# Altium footprint library PART.PcbLib: 407 footprints (part 14 of 26)
Each footprint in its own frame and in the unit in brackets; x right, y up, seen from the top. Pads: shape width x height; smd on the part's side, far side on the other; paste and mask are expansions set on the pad; w line width, h text height; cw(c..) or ccw(c..) is an arc to the next point about the centre after c.
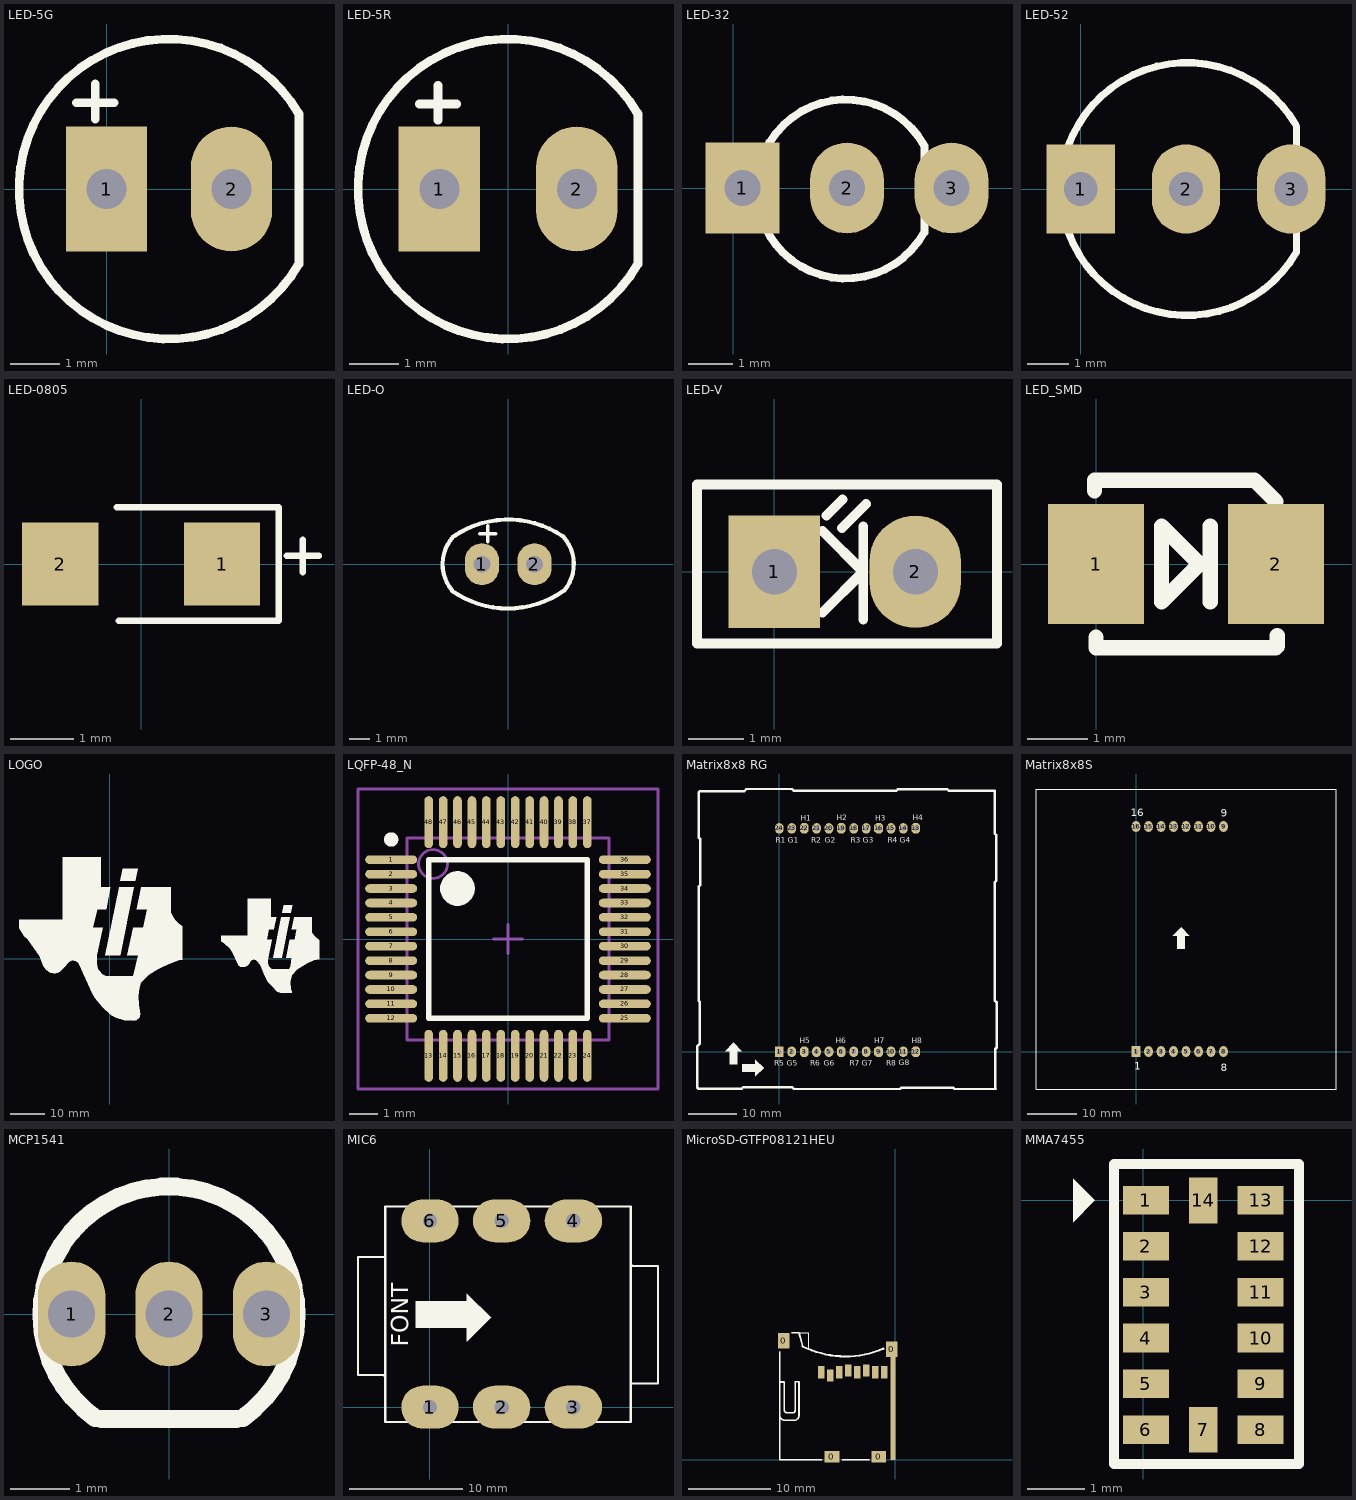
[diagram p13: the footprints below, top view; thin cyan lines are the x and y axes]

## LED-5G [mil] "LED 2 PIN, 5 ly ,Only Green Colour,pin to pin 100mil"
height 300
pads (2):
  rect 65x100 hole 32: 1(0,0)
  oval 65x100 hole 32: 2(100,0)
Top Overlay:
  lines w7: -24,69 6,69 ; -9,56 -9,84 ; 153.51,60.71 ccw(c50,0) 153.94,-59.97 ; 154,-59 154,60
3D body: height 386.85, standoff -67.48, extent -54.33,-103.66 154.33,105

## LED-5R [mil] "LED 2 PIN, 5 ly , Only Red colour, pin to pin 110mil"
height 300
pads (2):
  rect 65x100 hole 32: 1(-55,0)
  oval 65x100 hole 32: 2(55,0)
Top Overlay:
  lines w7: -71,68 -41,68 ; -56,55 -56,83 ; 103.51,60.71 ccw(c0,0) 103.94,-59.97 ; 104,-59 104,60
3D body: height 484.75, standoff -97.93, extent -115.69,-117 97.69,119.99

## LED-32 [mil] "LED 3 PIN, 3ly Two colour"
height 300
pads (3):
  rect 65x80 hole 32: 1(8,0)
  oval 65x80 hole 32: 2(100,0) 3(192,0)
Top Overlay:
  lines w7: 168,-39 168,37
  lines w7.01: 167.87,37.48 ccw(c99.08,-0.84) 167.97,-38.98

## LED-52 [mil] "LED 3 PIN, 5 ly , Two colour"
height 300
pads (3):
  rect 65x85 hole 32: 1(0,0)
  oval 65x85 hole 32: 2(100,0) 3(200,0)
Top Overlay:
  lines w7: 204.51,60.71 ccw(c101,0) 204.94,-59.97 ; 205,-59 205,59

## LED-0805 [mm] "Resistor SMD 80x50mil"
height 1.27
pads (2):
  rect 1.2x1.3 smd: 1(1.27,0) 2(-1.27,0)
Top Overlay:
  lines w0.102: -0.381,0.889 2.159,0.889 2.159,-0.889 -0.356,-0.889 ; 2.286,0.127 2.794,0.127 ; 2.54,-0.127 2.54,0.381
3D body: height 0.58, standoff -0.03, extent -0.965,-0.635 1.035,0.615

## LED-O [mil] "LED 2 PIN,  Ovan Only colour, pin to pin 110mil"
height 300
pads (2):
  oval 65x80 hole 32: 1(-50,0) 2(50,0)
Top Overlay:
  lines w7: -54,58 -24,58 ; -39,43 -39,73
  lines w8: -106.82,-49.85 cw(c-47,0) -104.5,52.5 ; -106.38,-51.11 ccw(c-0.81,100.81) 104.97,-50.96 ; -102.83,53.79 cw(c0,-100) 103.93,53.04 ; 104.5,52.5 cw(c47,0) 106.82,-49.85

## LED-V [mil] "LED 2 PIN, Rectang Only colour"
height 300
pads (2):
  rect 65x80 hole 32: 1(0,0)
  oval 65x80 hole 32: 2(100,0)
Top Overlay:
  lines w7: 34,-29 63,0 34,29 ; 37,40 48.3,51.3 ; 48,31 65,48 ; 63,-34 63,32 ; -55,-51 158,-51 158,62 -55,62 -55,-51

## LED_SMD [mm]
pads (2):
  rect 1.6x2 smd: 1(0,0) 2(3,0)
Top Overlay:
  lines w0.254: -0.025,1.219 -0.025,1.397 ; 0,-1.219 0,-1.397 2.997,-1.397 ; 0,1.397 2.642,1.397 2.997,1.041 ; 1.702,-0.025 1.092,-0.635 1.092,0.635 1.702,0.025 ; 1.905,-0.635 1.905,0.635 ; 3.023,-1.372 3.023,-1.194

## LOGO [mil]
Top Overlay:
  drawing of 6 lines, arcs and shapes, not listed

## LQFP-48_N [mm] "Thin QFP, 48-Leads, Body 7x7mm, Pitch 0.5mm, IPC Medium Density"
height 1.6
pads (48):
  oval 1.8x0.3 smd: 1(-4.05,2.75) 2(-4.05,2.25) 3(-4.05,1.75) 4(-4.05,1.25) 5(-4.05,0.75) 6(-4.05,0.25) 7(-4.05,-0.25) 8(-4.05,-0.75) 9(-4.05,-1.25) 10(-4.05,-1.75) 11(-4.05,-2.25) 12(-4.05,-2.75) 25(4.05,-2.75) 26(4.05,-2.25) 27(4.05,-1.75) 28(4.05,-1.25) 29(4.05,-0.75) 30(4.05,-0.25) 31(4.05,0.25) 32(4.05,0.75) 33(4.05,1.25) 34(4.05,1.75) 35(4.05,2.25) 36(4.05,2.75)
  oval 0.3x1.8 smd: 13(-2.75,-4.05) 14(-2.25,-4.05) 15(-1.75,-4.05) 16(-1.25,-4.05) 17(-0.75,-4.05) 18(-0.25,-4.05) 19(0.25,-4.05) 20(0.75,-4.05) 21(1.25,-4.05) 22(1.75,-4.05) 23(2.25,-4.05) 24(2.75,-4.05) 37(2.75,4.05) 38(2.25,4.05) 39(1.75,4.05) 40(1.25,4.05) 41(0.75,4.05) 42(0.25,4.05) 43(-0.25,4.05) 44(-0.75,4.05) 45(-1.25,4.05) 46(-1.75,4.05) 47(-2.25,4.05) 48(-2.75,4.05)
Top Overlay:
  circle w0.6: c-1.75,1.75 r0.3
  circle w0.25: c-4.05,3.45 r0.125
  lines w0.2: -2.75,-2.75 2.75,-2.75 2.75,2.75 -2.75,2.75 -2.75,-2.75
Mechanical 13:
  circle w0.1: c-2.6,2.6 r0.5
  lines w0.1: -3.5,-3.5 3.5,-3.5 3.5,3.5 -3.5,3.5 -3.5,-3.5
Mechanical 15:
  lines w0.1: -0.5,0 0.5,0 ; 0,-0.5 0,0.5 ; -5.2,-5.2 5.2,-5.2 5.2,5.2 -5.2,5.2 -5.2,-5.2
3D body: height 1.6, standoff 0, extent -3.5,-3.5 3.5,3.5

## Matrix8x8 RG [mil] "Matran 8x8 2mau,Body 60 X 60mm"
height 300
pads (24):
  rect 70x85 hole 37.4: 1(0,0)
  oval 70x85 hole 37.4: 2(100,0) 4(300,0) 5(400,0) 7(600,0) 8(700,0) 10(900,0) 11(1000,0) 14(1000,1800) 15(900,1800) 17(700,1800) 18(600,1800) 20(400,1800) 21(300,1800) 23(100,1800) 24(0,1800)
  oct 70x85 hole 37.4: 3(200,0) 6(500,0) 9(800,0) 12(1100,0) 13(1100,1800) 16(800,1800) 19(500,1800) 22(200,1800)
Top Overlay:
  region: -437,5 -371,71 -369,71 -304,6 -304,5 -341,5 -341,-101 -400,-101 -400,5
  region: -193,-63 -127,-129 -127,-131 -192,-196 -193,-196 -193,-159 -299,-159 -299,-100 -193,-100
  lines w20: -650,-300 -661,-289 -661,45 -640,66 -640,403 -650,413 -650,1331 -639,1342 -639,1716 -650,1727 -650,2090 -640,2100 -283,2100 -265,2118 103,2118 119,2102 941,2102 955,2116 1355,2116 1369,2102 1736,2102 1738,2100 1738,1757 1749,1746 1749,1379 1738,1368 1738,412 1752,398 1752,33 1742,23 1742,-299 1743,-300 1412,-300 1400,-288 984,-288 972,-300 117,-300 103,-286 -292,-286 -304,-298 -648,-298
  text "R8" at 863,-111 h45
  text "G8" at 962,-110 h45
  text "H8" at 1068,69 h45
  text "R7" at 568,-112 h45
  text "G7" at 664,-111 h45
  text "H7" at 765,68 h45
  text "R6" at 250,-111 h45
  text "G6" at 358,-111 h45
  text "H6" at 456,69 h45
  text "H5" at 166,68 h45
  text "G5" at 60,-111 h45
  text "R5" at -40,-112 h45
  text "R1" at -28,1684 h45
  text "G1" at 68,1685 h45
  text "H1" at 174,1864 h45
  text "H2" at 464,1865 h45
  text "G2" at 366,1685 h45
  text "R2" at 258,1685 h45
  text "H3" at 773,1864 h45
  text "G3" at 672,1685 h45
  text "R3" at 576,1684 h45
  text "H4" at 1076,1865 h45
  text "G4" at 970,1686 h45
  text "R4" at 874,1685 h45
Bottom Overlay:
  text "R8" at 932,-111 h45
  text "G8" at 1031,-110 h45
  text "H8" at 1137,69 h45
  text "R7" at 637,-112 h45
  text "G7" at 733,-111 h45
  text "H7" at 834,68 h45
  text "R6" at 319,-111 h45
  text "G6" at 427,-111 h45
  text "H6" at 525,69 h45
  text "H5" at 235,68 h45
  text "G5" at 129,-111 h45
  text "R5" at 29,-112 h45
  text "R1" at 41,1684 h45
  text "G1" at 137,1685 h45
  text "H1" at 243,1864 h45
  text "H2" at 533,1865 h45
  text "G2" at 435,1685 h45
  text "R2" at 327,1685 h45
  text "H3" at 842,1864 h45
  text "G3" at 741,1685 h45
  text "R3" at 645,1684 h45
  text "H4" at 1145,1865 h45
  text "G4" at 1039,1686 h45
  text "R4" at 943,1685 h45
3D body: height 150, standoff -100, extent -13.96,1785.23 16.63,1815.82
3D body: height 150, standoff -100, extent 86.04,1785.23 116.63,1815.82
3D body: height 150, standoff -100, extent 186.04,1785.23 216.63,1815.82
3D body: height 150, standoff -100, extent 286.04,1785.23 316.63,1815.82
3D body: height 150, standoff -100, extent 386.04,1785.23 416.63,1815.82
3D body: height 150, standoff -100, extent 486.04,1785.23 516.63,1815.82
3D body: height 150, standoff -100, extent 586.04,1785.23 616.63,1815.82
3D body: height 150, standoff -100, extent 686.04,1785.23 716.63,1815.82
3D body: height 150, standoff -100, extent 786.04,1785.23 816.63,1815.82
3D body: height 150, standoff -100, extent 886.04,1785.23 916.63,1815.82
3D body: height 150, standoff -100, extent 986.04,1785.23 1016.63,1815.82
3D body: height 150, standoff -100, extent -13.96,-14.77 16.63,15.82
3D body: height 150, standoff -100, extent 86.04,-14.77 116.63,15.82
3D body: height 150, standoff -100, extent 186.04,-14.77 216.63,15.82
3D body: height 150, standoff -100, extent 286.04,-14.77 316.63,15.82
3D body: height 150, standoff -100, extent 386.04,-14.77 416.63,15.82
3D body: height 150, standoff -100, extent 486.04,-14.77 516.63,15.82
3D body: height 150, standoff -100, extent 586.04,-14.77 616.63,15.82
3D body: height 150, standoff -100, extent 686.04,-14.77 716.63,15.82
3D body: height 150, standoff -100, extent 786.04,-14.77 816.63,15.82
3D body: height 150, standoff -100, extent 886.04,-14.77 916.63,15.82
3D body: height 150, standoff -100, extent 986.04,-14.77 1016.63,15.82
3D body: height 150, standoff -100, extent 1086.04,-14.77 1116.63,15.82
3D body: height 150, standoff -100, extent 1086.18,1785.37 1116.77,1815.96
3D body: height 310, standoff 299, extent -608,-258.48 -399.45,-52.53
3D body: height 310, standoff 299, extent -302.97,-261.27 -94.42,-55.31
3D body: height 310, standoff 299, extent -1.13,-258.37 207.42,-52.42
3D body: height 310, standoff 299, extent 291.44,-259.66 499.99,-53.7
3D body: height 310, standoff 299, extent 588.25,-261.96 796.79,-56
3D body: height 310, standoff 299, extent 888,-266.96 1096.55,-61
3D body: height 310, standoff 299, extent 1178,-261.96 1386.55,-56
3D body: height 310, standoff 299, extent 1489.67,-261.16 1698.22,-55.21
3D body: height 310, standoff 299, extent -608,41.52 -399.45,247.47
3D body: height 310, standoff 299, extent -302.97,38.73 -94.42,244.69
3D body: height 310, standoff 299, extent -1.13,41.63 207.42,247.58
3D body: height 310, standoff 299, extent 291.44,40.34 499.99,246.3
3D body: height 310, standoff 299, extent 588.25,38.04 796.79,244
3D body: height 310, standoff 299, extent 888,33.04 1096.55,239
3D body: height 310, standoff 299, extent 1178,38.04 1386.55,244
3D body: height 310, standoff 299, extent 1489.67,38.84 1698.22,244.79
3D body: height 310, standoff 299, extent -608,341.52 -399.45,547.47
3D body: height 310, standoff 299, extent -302.97,338.73 -94.42,544.69
3D body: height 310, standoff 299, extent -1.13,341.63 207.42,547.58
3D body: height 310, standoff 299, extent 291.44,340.34 499.99,546.3
3D body: height 310, standoff 299, extent 588.25,338.04 796.79,544
3D body: height 310, standoff 299, extent 888,333.04 1096.55,539
3D body: height 310, standoff 299, extent 1178,338.04 1386.55,544
3D body: height 310, standoff 299, extent 1489.67,338.84 1698.22,544.79
3D body: height 310, standoff 299, extent -608,641.52 -399.45,847.47
3D body: height 310, standoff 299, extent -302.97,638.73 -94.42,844.69
3D body: height 310, standoff 299, extent -1.13,641.63 207.42,847.58
3D body: height 310, standoff 299, extent 291.44,640.34 499.99,846.3
3D body: height 310, standoff 299, extent 588.25,638.04 796.79,844
3D body: height 310, standoff 299, extent 888,633.04 1096.55,839
3D body: height 310, standoff 299, extent 1178,638.04 1386.55,844
3D body: height 310, standoff 299, extent 1489.67,638.84 1698.22,844.79
3D body: height 310, standoff 299, extent -608,941.52 -399.45,1147.47
3D body: height 310, standoff 299, extent -302.97,938.73 -94.42,1144.69
3D body: height 310, standoff 299, extent -1.13,941.63 207.42,1147.58
3D body: height 310, standoff 299, extent 291.44,940.34 499.99,1146.3
3D body: height 310, standoff 299, extent 588.25,938.04 796.79,1144
3D body: height 310, standoff 299, extent 888,933.04 1096.55,1139
3D body: height 310, standoff 299, extent 1178,938.04 1386.55,1144
3D body: height 310, standoff 299, extent 1489.67,938.84 1698.22,1144.79
3D body: height 310, standoff 299, extent -608,1241.52 -399.45,1447.47
3D body: height 310, standoff 299, extent -302.97,1238.73 -94.42,1444.69
3D body: height 310, standoff 299, extent -1.13,1241.63 207.42,1447.58
3D body: height 310, standoff 299, extent 291.44,1240.34 499.99,1446.3
3D body: height 310, standoff 299, extent 588.25,1238.04 796.79,1444
3D body: height 310, standoff 299, extent 888,1233.04 1096.55,1439
3D body: height 310, standoff 299, extent 1178,1238.04 1386.55,1444
3D body: height 310, standoff 299, extent 1489.67,1238.84 1698.22,1444.79
3D body: height 310, standoff 299, extent -608,1541.52 -399.45,1747.47
3D body: height 310, standoff 299, extent -302.97,1538.73 -94.42,1744.69
3D body: height 310, standoff 299, extent -1.13,1541.63 207.42,1747.58
3D body: height 310, standoff 299, extent 291.44,1540.34 499.99,1746.3
3D body: height 310, standoff 299, extent 588.25,1538.04 796.79,1744
3D body: height 310, standoff 299, extent 888,1533.04 1096.55,1739
3D body: height 310, standoff 299, extent 1178,1538.04 1386.55,1744
3D body: height 310, standoff 299, extent 1489.67,1538.84 1698.22,1744.79
3D body: height 310, standoff 299, extent 1493.19,1837.31 1701.73,2043.27
3D body: height 310, standoff 299, extent 1181.52,1836.52 1390.06,2042.47
3D body: height 310, standoff 299, extent 891.52,1831.52 1100.06,2037.47
3D body: height 310, standoff 299, extent 591.76,1836.52 800.31,2042.47
3D body: height 310, standoff 299, extent 294.96,1838.82 503.5,2044.77
3D body: height 310, standoff 299, extent 2.38,1840.1 210.93,2046.06
3D body: height 310, standoff 299, extent -299.46,1837.21 -90.91,2043.17
3D body: height 310, standoff 299, extent -604.49,1839.99 -395.94,2045.95
3D body: height 309, standoff 299, extent -648,-293 1752,2102
3D body: height 300, standoff 100, extent -648,-298 1752,2102

## Matrix8x8S [mil] "Matran 8x8, Body 60 X 60mm"
height 300
pads (16):
  rect 70x85 hole 31: 1(0,0)
  oval 70x85 hole 31: 2(100,0) 3(200,0) 4(300,0) 5(400,0) 6(500,0) 7(600,0) 8(700,0) 9(700,1800) 10(600,1800) 11(500,1800) 12(400,1800) 13(300,1800) 14(200,1800) 15(100,1800) 16(0,1800)
Top Overlay:
  region: 294,927 360,993 362,993 427,928 427,927 390,927 390,821 331,821 331,927
  lines w7: -800,-300 1600,-300 ; -800,-300 1600,-300 ; -800,-300 -800,2100 ; -800,-300 -800,2100 ; -800,2100 1600,2100 ; -800,2100 1600,2100 ; 1600,-300 1600,2100 ; 1600,-300 1600,2100
  text "1" at -15,-144 h60
  text "8" at 678,-156 h60
  text "9" at 679,1880 h60
  text "16" at -42,1881 h60
3D body: height 150, standoff -100, extent 684.71,-15.29 715.29,15.29
3D body: height 150, standoff -100, extent 584.71,-15.29 615.29,15.29
3D body: height 150, standoff -100, extent 484.71,-15.29 515.29,15.29
3D body: height 150, standoff -100, extent 384.71,-15.29 415.29,15.29
3D body: height 150, standoff -100, extent 284.71,-15.29 315.29,15.29
3D body: height 150, standoff -100, extent 184.71,-15.29 215.29,15.29
3D body: height 150, standoff -100, extent 84.71,-15.29 115.29,15.29
3D body: height 150, standoff -100, extent -15.29,-15.29 15.29,15.29
3D body: height 150, standoff -100, extent 684.71,1784.71 715.29,1815.29
3D body: height 150, standoff -100, extent 584.71,1784.71 615.29,1815.29
3D body: height 150, standoff -100, extent 484.71,1784.71 515.29,1815.29
3D body: height 150, standoff -100, extent 384.71,1784.71 415.29,1815.29
3D body: height 150, standoff -100, extent 284.71,1784.71 315.29,1815.29
3D body: height 150, standoff -100, extent 184.71,1784.71 215.29,1815.29
3D body: height 150, standoff -100, extent 84.71,1784.71 115.29,1815.29
3D body: height 150, standoff -100, extent -15.29,1784.71 15.29,1815.29
3D body: height 310, standoff 299, extent -760,-260.48 -551.45,-54.53
3D body: height 310, standoff 299, extent -454.97,-263.27 -246.42,-57.31
3D body: height 310, standoff 299, extent -153.13,-260.37 55.42,-54.42
3D body: height 310, standoff 299, extent 139.44,-261.66 347.99,-55.7
3D body: height 310, standoff 299, extent 436.25,-263.96 644.79,-58
3D body: height 310, standoff 299, extent 736,-268.96 944.55,-63
3D body: height 310, standoff 299, extent 1026,-263.96 1234.55,-58
3D body: height 310, standoff 299, extent 1337.67,-263.16 1546.22,-57.21
3D body: height 310, standoff 299, extent -760,39.52 -551.45,245.47
3D body: height 310, standoff 299, extent -454.97,36.73 -246.42,242.69
3D body: height 310, standoff 299, extent -153.13,39.63 55.42,245.58
3D body: height 310, standoff 299, extent 139.44,38.34 347.99,244.3
3D body: height 310, standoff 299, extent 436.25,36.04 644.79,242
3D body: height 310, standoff 299, extent 736,31.04 944.55,237
3D body: height 310, standoff 299, extent 1026,36.04 1234.55,242
3D body: height 310, standoff 299, extent 1337.67,36.84 1546.22,242.79
3D body: height 310, standoff 299, extent -760,339.52 -551.45,545.47
3D body: height 310, standoff 299, extent -454.97,336.73 -246.42,542.69
3D body: height 310, standoff 299, extent -153.13,339.63 55.42,545.58
3D body: height 310, standoff 299, extent 139.44,338.34 347.99,544.3
3D body: height 310, standoff 299, extent 436.25,336.04 644.79,542
3D body: height 310, standoff 299, extent 736,331.04 944.55,537
3D body: height 310, standoff 299, extent 1026,336.04 1234.55,542
3D body: height 310, standoff 299, extent 1337.67,336.84 1546.22,542.79
3D body: height 310, standoff 299, extent -760,639.52 -551.45,845.47
3D body: height 310, standoff 299, extent -454.97,636.73 -246.42,842.69
3D body: height 310, standoff 299, extent -153.13,639.63 55.42,845.58
3D body: height 310, standoff 299, extent 139.44,638.34 347.99,844.3
3D body: height 310, standoff 299, extent 436.25,636.04 644.79,842
3D body: height 310, standoff 299, extent 736,631.04 944.55,837
3D body: height 310, standoff 299, extent 1026,636.04 1234.55,842
3D body: height 310, standoff 299, extent 1337.67,636.84 1546.22,842.79
3D body: height 310, standoff 299, extent -760,939.52 -551.45,1145.47
3D body: height 310, standoff 299, extent -454.97,936.73 -246.42,1142.69
3D body: height 310, standoff 299, extent -153.13,939.63 55.42,1145.58
3D body: height 310, standoff 299, extent 139.44,938.34 347.99,1144.3
3D body: height 310, standoff 299, extent 436.25,936.04 644.79,1142
3D body: height 310, standoff 299, extent 736,931.04 944.55,1137
3D body: height 310, standoff 299, extent 1026,936.04 1234.55,1142
3D body: height 310, standoff 299, extent 1337.67,936.84 1546.22,1142.79
3D body: height 310, standoff 299, extent -760,1239.52 -551.45,1445.47
3D body: height 310, standoff 299, extent -454.97,1236.73 -246.42,1442.69
3D body: height 310, standoff 299, extent -153.13,1239.63 55.42,1445.58
3D body: height 310, standoff 299, extent 139.44,1238.34 347.99,1444.3
3D body: height 310, standoff 299, extent 436.25,1236.04 644.79,1442
3D body: height 310, standoff 299, extent 736,1231.04 944.55,1437
3D body: height 310, standoff 299, extent 1026,1236.04 1234.55,1442
3D body: height 310, standoff 299, extent 1337.67,1236.84 1546.22,1442.79
3D body: height 310, standoff 299, extent -760,1539.52 -551.45,1745.47
3D body: height 310, standoff 299, extent -454.97,1536.73 -246.42,1742.69
3D body: height 310, standoff 299, extent -153.13,1539.63 55.42,1745.58
3D body: height 310, standoff 299, extent 139.44,1538.34 347.99,1744.3
3D body: height 310, standoff 299, extent 436.25,1536.04 644.79,1742
3D body: height 310, standoff 299, extent 736,1531.04 944.55,1737
3D body: height 310, standoff 299, extent 1026,1536.04 1234.55,1742
3D body: height 310, standoff 299, extent 1337.67,1536.84 1546.22,1742.79
3D body: height 310, standoff 299, extent 1341.19,1835.31 1549.73,2041.27
3D body: height 310, standoff 299, extent 1029.52,1834.52 1238.06,2040.47
3D body: height 310, standoff 299, extent 739.52,1829.52 948.06,2035.47
3D body: height 310, standoff 299, extent 439.76,1834.52 648.31,2040.47
3D body: height 310, standoff 299, extent 142.96,1836.82 351.5,2042.77
3D body: height 310, standoff 299, extent -149.62,1838.1 58.93,2044.06
3D body: height 310, standoff 299, extent -451.46,1835.21 -242.91,2041.17
3D body: height 310, standoff 299, extent -756.49,1837.99 -547.94,2043.95
3D body: height 309, standoff 299, extent -800,-295 1600,2100
3D body: height 300, standoff 100, extent -800,-300 1600,2100

## MCP1541 [mil]
pads (3):
  oval 45x70 hole 31.5: 1(-65,0) 2(0,0) 3(65,0)
Top Overlay:
  lines w12: -49.41,-69.17 cw(c0,0) 49.41,-69.17 ; -45,-70 45,-70

## MIC6 [mil] "Jac Mic 6 pin to"
pads (6):
  oval 200x150 hole 50: 1(0,0) 2(250,0) 3(500,0) 4(500,650) 5(250,650) 6(0,650)
Top Overlay:
  region: -50,369 -50,277 130,277 129,278 129,230 130,230 212,312 213,312 129,396 129,369
  lines w7: -156,-51 -156,699 ; -156,89 -156,525 -158,523 -251,523 -251,112 -162,112 -156,106 ; -156,700 700,700 700,590 ; -155,-52 -154,-51 -153,-52 700,-52 700,82 ; 700,499 706,493 795,493 795,82 702,82 700,80 700,594
  text "FONT" at -75,210 h60

## MicroSD-GTFP08121HEU [mm] "Push anh lock, push end open (15.2x14.0x1.88mm)"
height 1.88
pads (13):
  rect 1.4x1.9 smd: 0(-13.6,14.55) 0(-0.45,13.5)
  rect 1.8x1.4 smd: 0(-7.75,0.4) 0(-2.05,0.4)
  rect 0.6x12.6 smd: 0(-0.305,6.299)
  rect 0.8x1.5 smd: 1(-9.05,10.7) 2(-7.95,10.3) 3(-6.85,10.7) 4(-5.75,10.9) 5(-4.65,10.7) 6(-3.55,10.9) 7(-2.45,10.7) 8(-1.35,10.7)
Top Overlay:
  lines w0.152: -11.684,15.494 -10.592,15.494 -10.592,13.64
  lines w0.203: -14.122,0 -14.122,13.208 ; -14.122,8.865 -14.122,5.461 ccw(c-13.487,5.461) -13.487,4.826 -12.37,4.826 ccw(c-12.37,5.436) -11.76,5.436 -11.76,8.865 ; -14.097,0 -9.017,0 ; -14.097,9.5 -13.589,9.5 cw(c-13.589,9.474) -13.564,9.474 -13.564,6.071 ccw(c-13.259,6.071) -13.259,5.766 -12.471,5.766 ccw(c-12.471,5.994) -12.243,5.994 -12.243,9.449 cw(c-12.141,9.449) -12.141,9.55 -11.811,9.55 cw(c-11.811,9.5) -11.76,9.5 -11.76,8.839 ; -12.624,15.519 -11.76,15.519 -11.328,13.868 ; -11.354,13.894 cw(c-11.354,13.843) -11.303,13.843 ; -6.452,0 -3.226,0
  lines w0.254: -11.322,13.856 ccw(c-6.086,24.356) -1.487,13.562

## MMA7455 [mm]
pads (14):
  rect 0.8x0.5 smd: 1(0.051,0) 2(0.051,-0.8) 3(0.051,-1.6) 4(0.051,-2.4) 5(0.051,-3.2) 6(0.051,-4) 8(2.051,-4) 9(2.051,-3.2) 10(2.051,-2.4) 11(2.051,-1.6) 12(2.051,-0.8) 13(2.051,0)
  rect 0.5x0.8 smd: 7(1.051,-4) 14(1.051,0)
Top Overlay:
  region: -1.219,0.381 -0.838,0 -1.219,-0.381
  lines w0.178: -0.508,-4.572 -0.508,0.635 2.718,0.635 2.718,-4.597 ; 2.718,-4.597 -0.508,-4.597 2.718,-4.597